# Altium footprint library neoxin.PcbLib: 61 footprints (part 2 of 4)
Each footprint in its own frame and in the unit in brackets; x right, y up, seen from the top. Pads: shape width x height; smd on the part's side, far side on the other; paste and mask are expansions set on the pad; w line width, h text height; cw(c..) or ccw(c..) is an arc to the next point about the centre after c.
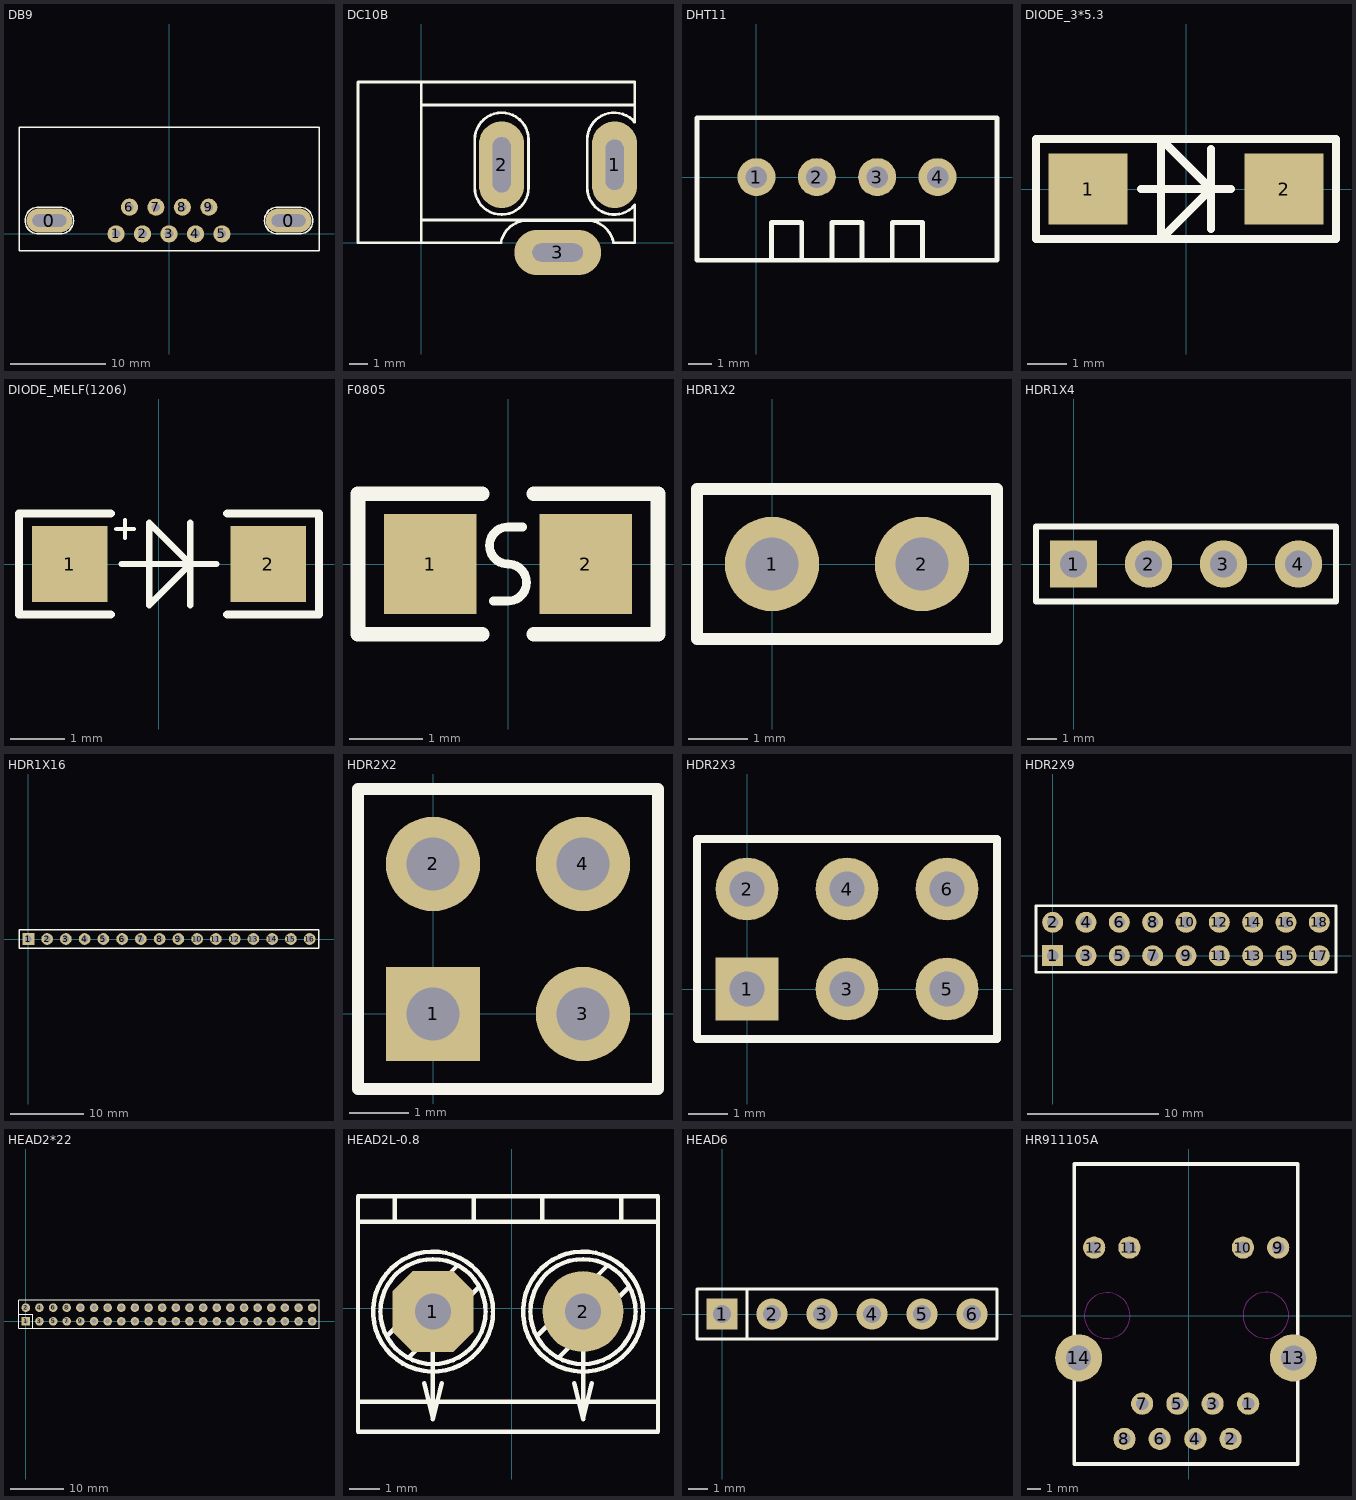
[diagram p1: the footprints below, top view; thin cyan lines are the x and y axes]

## DB9 [mm]
pads (11):
  oval 4.8x2.5 hole 1.27 slot 3.556 at 0 deg: 0(-12.522,1.397) 0(12.522,1.397)
  round 1.8 hole 0.9: 1(-5.537,0) 2(-2.769,0) 3(0,0) 4(2.769,0) 5(5.537,0) 6(-4.14,2.794) 7(-1.372,2.794) 8(1.397,2.794) 9(4.166,2.794)
Top Overlay:
  lines w0.152: -15.697,-1.778 15.697,-1.778 15.697,11.176 -15.697,11.176 -15.697,-1.778 ; -13.665,0 cw(c-13.665,1.397) -13.665,2.794 -11.379,2.794 cw(c-11.379,1.397) -11.379,0 -13.665,0 ; 11.379,0 cw(c11.379,1.397) 11.379,2.794 13.665,2.794 cw(c13.665,1.397) 13.665,0 11.379,0
3D body "User Library-DRB-9FA.STEP": height 12.6, standoff -4, extent -15.374,-1.555 15.426,16.345

## DC10B [mm]
pads (3):
  oval 2.5x4.8 hole 1 slot 2.794 at 90 deg: 1(10.693,4.318)
  oval 2.5x4.8 hole 1 slot 3.048 at 90 deg: 2(4.445,4.318)
  oval 4.8x2.5 hole 1 slot 2.794 at 0 deg: 3(7.544,-0.533)
Top Overlay:
  lines w0.152: 0,1.27 11.811,1.27 ; 0,7.62 11.687,7.62 11.792,7.62 ; 0.127,8.89 -0.381,8.89 -3.5,8.89 -3.5,0 0,0 ; 4.293,0 0,0 ; 4.403,0.004 cw(c5.867,-0.254) 5.867,1.232 9.169,1.232 cw(c9.169,-0.254) 10.633,0.004 ; 10.668,0 11.811,0 11.811,2.032 ; 11.807,2.093 cw(c10.668,3.048) 9.182,3.048 9.181,5.715 cw(c10.668,5.715) 11.807,6.67 11.811,8.89 0,8.89 0,0 ; 5.931,5.715 ccw(c4.445,5.715) 2.959,5.715 2.958,3.048 ccw(c4.445,3.048) 5.931,3.048 5.931,5.715 ; 5.931,5.715 5.932,5.715
3D body "User Library-dc range - dc connector[4840_2201].STEP": height 11.02, standoff -3.48, extent -3.038,-0.685 10.788,8.821

## DHT11 [mm]
pads (4):
  round 1.6 hole 0.9: 1(0,0) 2(2.54,0) 3(5.08,0) 4(7.62,0)
Top Overlay:
  lines w0.203: -2.5,-3.5 7.62,-3.5 10.12,-3.5 ; -2.5,-3.46 -2.5,0 -2.5,2.5 7.62,2.5 10.12,2.5 10.12,0 10.12,-3.46 ; 0.635,-3.5 0.635,-1.905 1.905,-1.905 1.905,-3.5 ; 3.175,-3.5 3.175,-1.905 4.445,-1.905 4.445,-3.5 ; 5.715,-3.5 5.715,-1.905 6.985,-1.905 6.985,-3.5
3D body "4pin-2.5.step": height 7, standoff -3.4, extent -2.466,-3.383 9.934,2.367

## DIODE_3*5.3 [mm]
pads (2):
  rect 2x1.8 smd: 1(-2.489,0) 2(2.489,0)
Top Overlay:
  lines w0.2: -1.143,0 -0.635,0 1.143,0 ; 0.508,0 0.508,-0.127 -0.635,-1.27 -0.635,1.27 0.508,0.127 ; 0.635,-1.016 0.635,1.016 ; -3.81,-1.27 -3.81,1.27 3.81,1.27 3.81,-1.27 -3.81,-1.27
3D body: height 1.52, standoff 0, extent -2.386,-1.116 2.386,1.116

## DIODE_MELF(1206) [mm]
pads (2):
  rect 1.4x1.4 smd: 1(-1.651,0) 2(2.032,0)
Top Overlay:
  lines w0.076: -0.787,0.648 -0.457,0.648 ; -0.622,0.483 -0.622,0.813
  lines w0.12: -0.686,0 1.067,0 ; 0.584,-0.762 0.584,0.762 ; -0.178,-0.762 0.584,0 -0.178,0.762 -0.178,-0.762
  lines w0.15: -0.889,-0.94 -2.591,-0.94 -2.591,0.94 -0.889,0.94 ; 1.27,-0.94 2.972,-0.94 2.972,0.94 1.27,0.94
3D body "Diode MELF.STEP": height 1.51, standoff 0.01, extent -1.496,-0.75 2.004,0.75

## F0805 [mil]
pads (2):
  rect 50x54 smd: 1(-42,0) 2(42,0)
Top Overlay:
  lines w4.72: -8,-20 0,-20 ccw(c0,-10) 10,-10 ccw(c0,-10) 0,0 cw(c0,10) -10,10 cw(c0,10) 0,20 8,20
  lines w7.87: -14,-38 -81,-38 -81,38 -14,38 ; 14,-38 81,-38 81,38 14,38
3D body "User Library-RES_2013-0805.STEP": height 29.92, standoff 0, extent -45.27,-26.57 45.28,26.58

## HDR1X2 [mm]
pads (2):
  round 1.6 hole 0.9: 1(0,0) 2(2.54,0)
Top Overlay:
  lines w0.2: -1.27,-1.27 -1.27,1.27 3.81,1.27 3.81,-1.27 -1.27,-1.27
3D body "1001-2.STEP": height 8.54, standoff -3, extent -1.27,-1.27 3.81,1.27

## HDR1X4 [mm]
pads (4):
  rect 1.6x1.6 hole 0.9: 1(0,0)
  round 1.6 hole 0.9: 2(2.54,0) 3(5.08,0) 4(7.62,0)
Top Overlay:
  lines w0.2: -1.27,-1.27 8.89,-1.27 8.89,1.27 -1.27,1.27 -1.27,-1.27
3D body "Header_Male_4Pin.STEP": height 8.74, standoff -2.8, extent -1.27,-1.27 8.89,1.22

## HDR1X16 [mm]
pads (16):
  rect 1.6x1.6 hole 0.9: 1(0,0)
  round 1.6 hole 0.9: 2(2.54,0) 3(5.08,0) 4(7.62,0) 5(10.16,0) 6(12.7,0) 7(15.24,0) 8(17.78,0) 9(20.32,0) 10(22.86,0) 11(25.4,0) 12(27.94,0) 13(30.48,0) 14(33.02,0) 15(35.56,0) 16(38.1,0)
Top Overlay:
  lines w0.2: -1.27,-1.27 39.37,-1.27 39.37,1.27 0.635,1.27 -1.27,1.27 -1.27,-1.27
3D body "Header_Male_6Pin.STEP": height 8.74, standoff -2.8, extent 24.13,-1.22 39.37,1.27
3D body "Header_Male_6Pin.STEP": height 8.74, standoff -2.8, extent -1.27,-1.27 13.97,1.22
3D body "Header_Male_4Pin.STEP": height 8.74, standoff -2.8, extent 13.97,-1.22 24.13,1.27

## HDR2X2 [mm]
pads (4):
  rect 1.6x1.6 hole 0.9: 1(0,0)
  round 1.6 hole 0.9: 2(0,2.54) 3(2.54,0) 4(2.54,2.54)
Top Overlay:
  lines w0.2: -1.27,-1.27 3.81,-1.27 3.81,3.81 -1.27,3.81 -1.27,-1.27
3D body "User Library-PLD-4.step": height 8.54, standoff -3, extent -1.27,-1.27 3.81,3.81

## HDR2X3 [mm]
pads (6):
  rect 1.6x1.6 hole 0.9: 1(0,0)
  round 1.6 hole 0.9: 2(0,2.54) 3(2.54,0) 4(2.54,2.54) 5(5.08,0) 6(5.08,2.54)
Top Overlay:
  lines w0.2: 1.482,-1.27 6.35,-1.27 ; 6.35,-1.27 -1.27,-1.27 -1.27,3.81 6.35,3.81 6.35,-1.27
3D body "User Library-PLD-6.step": height 8.4, standoff -3, extent -1.27,-1.23 6.35,3.77

## HDR2X9 [mm]
pads (18):
  rect 1.6x1.6 hole 0.9: 1(0,0)
  round 1.6 hole 0.9: 2(0,2.54) 3(2.54,0) 4(2.54,2.54) 5(5.08,0) 6(5.08,2.54) 7(7.62,0) 8(7.62,2.54) 9(10.16,0) 10(10.16,2.54) 11(12.7,0) 12(12.7,2.54) 13(15.24,0) 14(15.24,2.54) 15(17.78,0) 16(17.78,2.54) 17(20.32,0) 18(20.32,2.54)
Top Overlay:
  lines w0.2: -1.27,-1.27 21.59,-1.27 21.59,3.81 -1.27,3.81 -1.27,-1.27
3D body "User Library-PLD-xx.step": height 8.4, standoff -3, extent -1.27,-1.23 21.59,3.77

## HEAD2*22 [mm]
pads (44):
  rect 1.6x1.6 hole 0.9: 1(0.011,0.011)
  round 1.6 hole 0.9: 2(0.011,2.551) 3(2.551,0.011) 4(2.551,2.551) 5(5.091,0.011) 6(5.091,2.551) 7(7.631,0.011) 8(7.631,2.551) 9(10.171,0.011) 10(10.171,2.551) 11(12.711,0.011) 12(12.711,2.551) 13(15.251,0.011) 14(15.251,2.551) 15(17.791,0.011) 16(17.791,2.551) 17(20.331,0.011) 18(20.331,2.551) 19(22.871,0.011) 20(22.871,2.551) 21(25.411,0.011) 22(25.411,2.551) 23(27.951,0.011) 24(27.951,2.551) 25(30.491,0.011) 26(30.491,2.551) 27(33.031,0.011) 28(33.031,2.551) 29(35.571,0.011) 30(35.571,2.551) 31(38.111,0.011) 32(38.111,2.551) 33(40.651,0.011) 34(40.651,2.551) 35(43.18,0) 36(43.18,2.54) 37(45.72,0) 38(45.72,2.54) 39(48.26,0) 40(48.26,2.54) 41(50.8,0) 42(50.8,2.54) 43(53.34,0) 44(53.34,2.54)
Top Overlay:
  lines w0.178: -1.259,1.3 1.3,1.3 1.3,-1.259 ; -1.259,-1.259 -1.259,3.821 -1.259,3.959 -1.218,4 54.61,4 54.61,-1.259 41.921,-1.259 -1.259,-1.259
3D body "User Library-PLD-4.step": height 8.54, standoff -3, extent -1.24,-1.24 3.84,3.84
3D body "User Library-PLD-xx.step": height 8.4, standoff -3, extent 3.835,-1.154 29.235,3.846
3D body "User Library-PLD-xx.step": height 8.4, standoff -3, extent 29.236,-1.154 54.636,3.846

## HEAD2L-0.8 [mm]
pads (2):
  oct 2.7x2.7 hole 1.2: 1(-2.631,-0.105)
  round 2.7 hole 1.2: 2(2.369,-0.105)
Top Overlay:
  circle w0.15: c2.369,-0.105 r2
  circle w0.15: c2.369,-0.105 r1.75
  circle w0.15: c-2.631,-0.105 r2
  circle w0.15: c-2.631,-0.105 r1.75
  lines w0.15: -5.131,-3.105 4.869,-3.105 ; -5.131,2.895 4.869,2.895 ; -4.144,-0.897 -1.833,1.415 ; -3.912,2.895 -3.912,3.734 ; -3.429,-1.626 -1.118,0.686 ; -2.921,-2.495 -2.631,-3.699 ; -2.631,-0.105 -2.631,-3.699 ; -2.341,-2.495 -2.631,-3.699 ; -1.27,2.895 -1.27,3.734 ; 0.856,-0.897 3.167,1.415 ; 1.008,2.895 1.008,3.734 ; 1.571,-1.626 3.882,0.686 ; 2.079,-2.495 2.369,-3.699 ; 2.369,-0.105 2.369,-3.699 ; 2.659,-2.495 2.369,-3.699 ; 3.65,2.895 3.65,3.734 ; -5.131,-4.105 4.869,-4.105 4.869,3.734 -5.131,3.734 -5.131,-4.105
3D body "User Library-CN_BT_1X2.step": height 10, standoff -2.28, extent -5.622,-3.955 4.878,3.745

## HEAD6 [mm]
pads (6):
  rect 1.6x1.6 hole 0.9: 1(0,0)
  round 1.6 hole 0.9: 2(2.54,0) 3(5.08,0) 4(7.62,0) 5(10.16,0) 6(12.7,0)
Top Overlay:
  lines w0.15: 1.27,-1.27 1.27,1.27 ; -1.27,-1.27 13.97,-1.27 13.97,1.27 -1.27,1.27 -1.27,-1.27
3D body "User Library-BL1-006-S842-55.step": height 8.42, standoff -3.2, extent -1.52,-1.27 14.22,1.27

## HR911105A [mm]
pads (14):
  round 1.6 hole 0.9: 1(4.293,-6.325) 2(3.023,-8.865) 3(1.727,-6.325) 4(0.483,-8.865) 5(-0.813,-6.325) 6(-2.083,-8.865) 7(-3.353,-6.325) 8(-4.623,-8.865) 9(6.452,4.928) 10(3.912,4.928) 11(-4.267,4.928) 12(-6.807,4.928)
  round 3.4 hole 1.8: 13(7.544,-3.023) 14(-7.925,-3.023)
Top Overlay:
  lines w0.254: -8.255,-10.668 -8.255,10.947 7.874,10.947 7.874,-10.668 -8.255,-10.668
Keep-Out Layer:
  circle w0.051: c-5.866,0.025 r1.65
  circle w0.051: c5.564,0.051 r1.65
3D body "User Library-RMS-001L-08A0-GY.STEP": height 2.3, standoff -14.5, extent -8.255,-10.472 7.745,10.828